# Altium footprint library BARKO_PCBLIB.PcbLib: 531 footprints (part 11 of 34)
Each footprint in its own frame and in the unit in brackets; x right, y up, seen from the top. Pads: shape width x height; smd on the part's side, far side on the other; paste and mask are expansions set on the pad; w line width, h text height; cw(c..) or ccw(c..) is an arc to the next point about the centre after c.
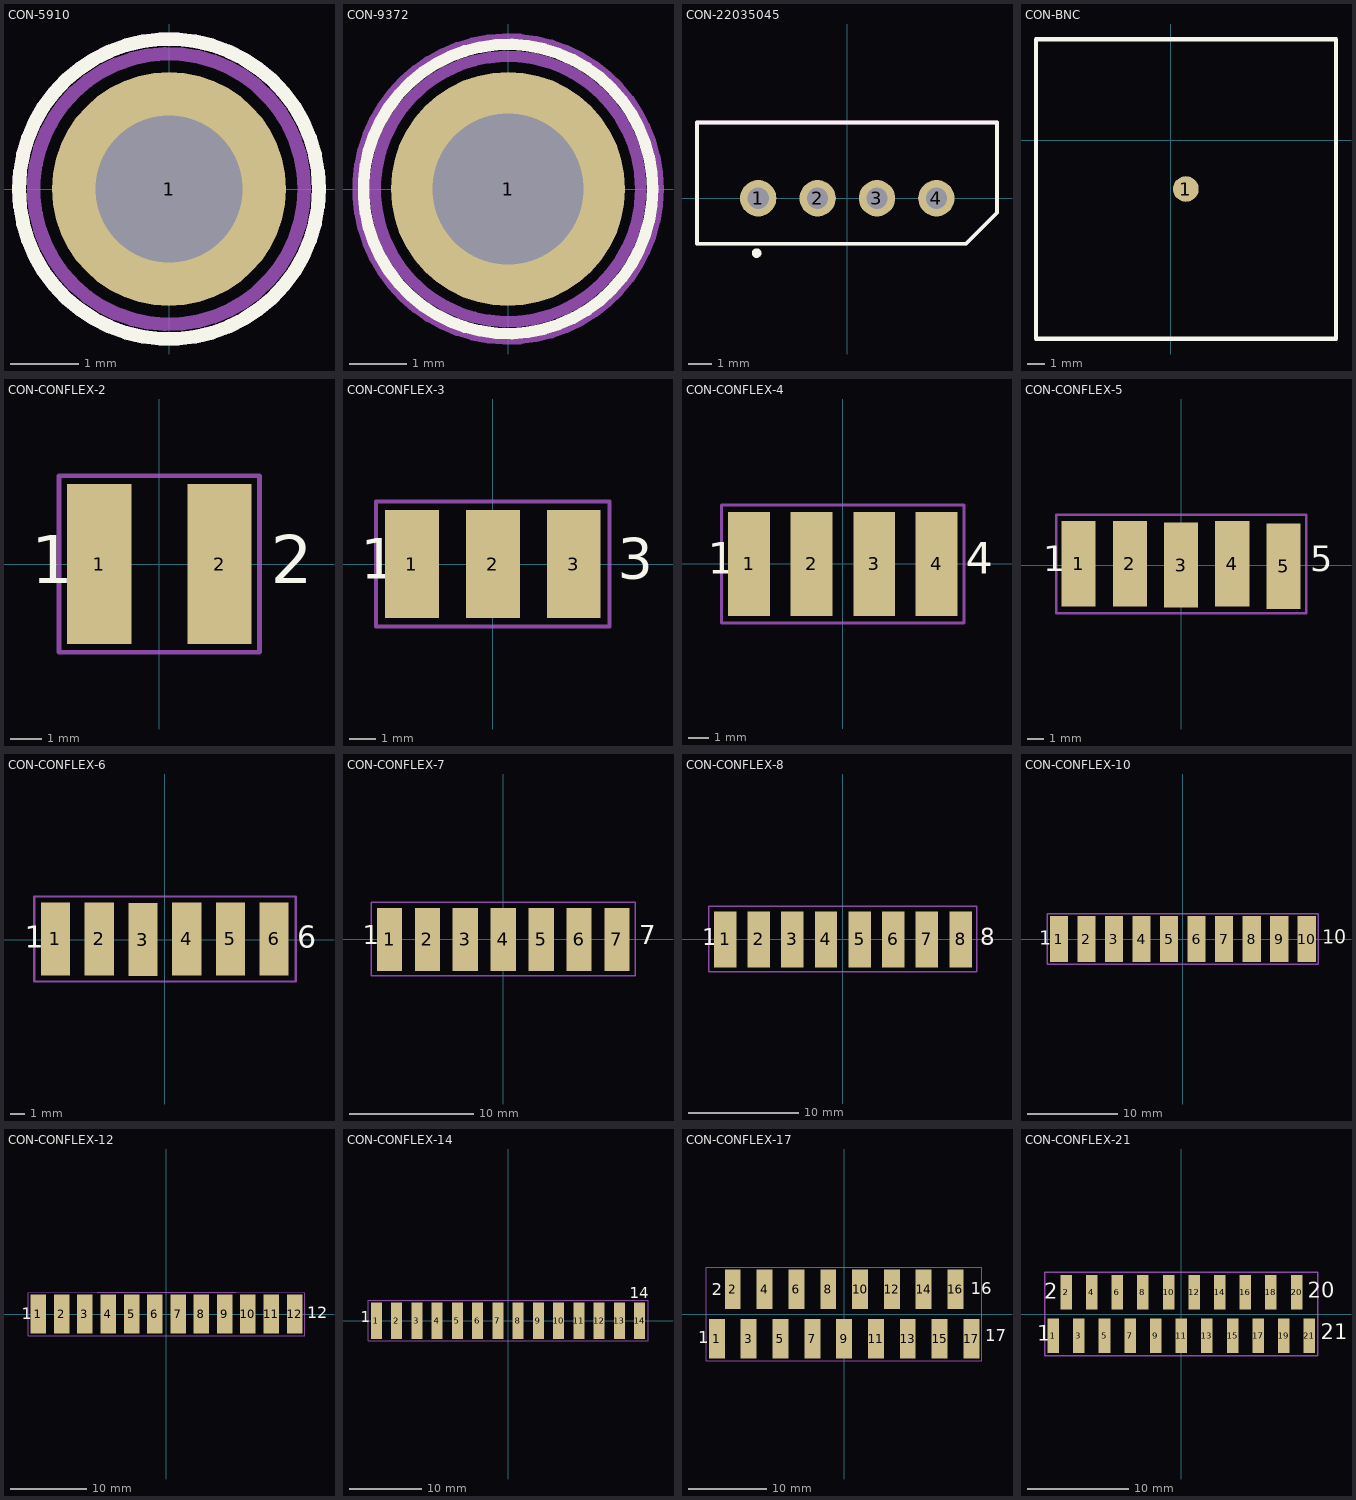
[diagram p10: the footprints below, top view; thin cyan lines are the x and y axes]

## CON-5910 [mil]
height 679.92
pads (1):
  round 135 hole 85: 1(0,0)
Top Overlay:
  circle w7.87: c0,0 r86.61
Mechanical 15:
  circle w7.87: c0,0 r86.61
  lines w3.94: -35.43,0 35.43,0 ; 0,-35.43 0,35.43
ASM Top:
  circle w7.87: c0,0 r78.15
  text ".designator" at -11.81,-3.94 h59.06
3D body "mill-max-5910-0-00-15-00-00-03-0.step": height 20.52, standoff -659.53, extent -55,-54.99 55,55.34

## CON-9372 [mil]
pads (1):
  round 160 hole 103: 1(0,0)
Top Overlay:
  circle w7.87: c0,0 r98.66
Bottom Overlay:
  circle w7.87: c0,0 r98.66
Mechanical 15:
  circle w7.87: c0,0 r102.36
  lines w3.94: -39.37,0 39.37,0 ; 0,-39.37 0,39.37
ASM Top:
  circle w7.87: c0,0 r90.64
  text ".designator" at -11.81,-11.81 h59.06
3D body "mill-max-9372-0-15-01-23-XX-10-0.step": height 12.54, standoff -107.5, extent -58.99,-58.99 59.05,59

## CON-22035045 [mil]
pads (4):
  round 60 hole 35: 1(-147,0) 2(-49,0) 3(49,0) 4(147,0)
Top Overlay:
  circle w7.87: c-149.61,-90.55 r3.94
  lines w5.91: 196,-75 247,-24
  lines w6: -248,-75 -248,125 247,125 247,-24 196,-75 -248,-75
ASM Top:
  lines w6: -248,-75 -248,125 247,125 247,-24 196,-75 -248,-75
  text ".designator" at -27.56,15.75 h31.5
3D body "022035045.stp": height 232.79, standoff -137.29, extent -244.1,-72.06 244.09,120.86

## CON-BNC [mm]
pads (1):
  round 1.5 smd: 1(0.88,-2.86)
Top Overlay:
  lines w0.254: -7.87,-11.61 9.643,-11.61 9.643,5.89 -7.87,5.89 -7.87,-11.61
3D body "Bnc_7684.stp": height 26.95, standoff 0.01, extent -7.87,-11.61 9.643,5.89

## CON-CONFLEX-2 [mil]
pads (2):
  rect 80x200 smd mask+4: 1(-75,0) 2(75,0)
Top Overlay:
  text "2" at 139,-24 h60
  text "1" at -160,-24 h60
ASM Top:
  lines w6: -125,-110 -125,110 125,110 125,-110 -125,-110

## CON-CONFLEX-3 [mil]
pads (3):
  rect 80x160 smd: 1(-120,0) 2(0,0) 3(120,0)
Top Overlay:
  text "1" at -196,-22 h60
  text "3" at 185,-22 h60
ASM Top:
  lines w6: -173,-93 -173,93 173,93 173,-93 -173,-93

## CON-CONFLEX-4 [mil]
pads (4):
  rect 80x200 smd: 1(-180,0) 2(-60,0) 3(60,0) 4(180,0)
Top Overlay:
  text "4" at 236,-19 h60
  text "1" at -259,-19 h60
ASM Top:
  lines w6: -233,-113 233,-113 233,113 -233,113 -233,-113

## CON-CONFLEX-5 [mil]
pads (5):
  rect 80x200 smd: 1(-240,3) 2(-120,3) 3(0,0) 4(120,3) 5(240,-3)
Top Overlay:
  text "1" at -323,-15 h60
  text "5" at 303,-15 h60
ASM Top:
  lines w6: -293,-113 -293,118 293,118 293,-113 -293,-113

## CON-CONFLEX-6 [mil]
pads (6):
  rect 80x200 smd: 1(-300,2) 2(-180,2) 3(-60,0) 4(60,2) 5(180,2) 6(300,2)
Top Overlay:
  text "6" at 363,-23 h60
  text "1" at -384,-23 h60
ASM Top:
  lines w6: -358,-115 359,-115 359,118 -358,118 -358,-115

## CON-CONFLEX-7 [mil]
pads (7):
  rect 80x200 smd: 1(-360,0) 2(-240,0) 3(-120,0) 4(0,0) 5(120,0) 6(240,0) 7(360,0)
Top Overlay:
  text "7" at 430,-15 h60
  text "1" at -445,-15 h60
ASM Top:
  lines w6: -418,-115 -418,118 418,118 418,-115 -418,-115

## CON-CONFLEX-8 [mil]
pads (8):
  rect 80x200 smd: 1(-420,0) 2(-300,0) 3(-180,0) 4(-60,0) 5(60,0) 6(180,0) 7(300,0) 8(420,0)
Top Overlay:
  text "1" at -501,-20 h60
  text "8" at 490,-20 h60
ASM Top:
  lines w6: -478,-115 -478,118 478,118 478,-115 -478,-115

## CON-CONFLEX-10 [mil]
pads (10):
  rect 80x200 smd mask+4: 1(-540,0) 2(-420,0) 3(-300,0) 4(-180,0) 5(-60,0) 6(60,0) 7(180,0) 8(300,0) 9(420,0) 10(540,0)
Top Overlay:
  text "10" at 608,-21 h60
  text "1" at -625,-25 h60
ASM Top:
  lines w6: -590,-110 590,-110 590,110 -590,110 -590,-110
  text ".designator" at -23.62,0 h31.5

## CON-CONFLEX-12 [mil]
pads (12):
  rect 80x200 smd mask+4: 1(-660,0) 2(-540,0) 3(-420,0) 4(-300,0) 5(-180,0) 6(-60,0) 7(60,0) 8(180,0) 9(300,0) 10(420,0) 11(540,0) 12(660,0)
Top Overlay:
  text "12" at 726,-23 h60
  text "1" at -746,-28 h60
ASM Top:
  lines w6: -713,-113 -713,110 -355.5,113 357.5,113 713,110 713,-113 -713,-113

## CON-CONFLEX-14 [mil]
pads (14):
  rect 60x200 smd mask+4: 1(-715,0) 2(-605,0) 3(-495,0) 4(-385,0) 5(-275,0) 6(-165,0) 7(-55,0) 8(55,0) 9(165,0) 10(275,0) 11(385,0) 12(495,0) 13(605,0) 14(715,0)
Top Overlay:
  text "1" at -801,-8 h60
  text "14" at 662,123 h60
ASM Top:
  lines w6: -760,-110 763,-110 763,110 -760,110 -760,-110

## CON-CONFLEX-17 [mil]
pads (17):
  rect 80x200 smd mask+4: 1(-640,-125) 2(-560,125) 3(-480,-125) 4(-400,125) 5(-320,-125) 6(-240,125) 7(-160,-125) 8(-80,125) 9(0,-125) 10(80,125) 11(160,-125) 12(240,125) 13(320,-125) 14(400,125) 15(480,-125) 16(560,125) 17(640,-125)
Top Overlay:
  text "17" at 709,-138 h60
  text "16" at 637,99 h60
  text "2" at -667,95 h60
  text "1" at -734,-148 h60
ASM Top:
  lines w6: -693,-235 693,-235 693,235 -693,235 -693,-235

## CON-CONFLEX-21 [mil]
pads (21):
  rect 45x135 smd: 1(-500,-85) 2(-450,85) 3(-400,-85) 4(-350,85) 5(-300,-85) 6(-250,85) 7(-200,-85) 8(-150,85) 9(-100,-85) 10(-50,85) 11(0,-85) 12(50,85) 13(100,-85) 14(150,85) 15(200,-85) 16(250,85) 17(300,-85) 18(350,85) 19(400,-85) 20(450,85) 21(500,-85)
Top Overlay:
  text "1" at -562,-105 h60
  text "2" at -535,60 h60
  text "20" at 493,63 h60
  text "21" at 544,-99 h60
ASM Top:
  lines w6: -533,-163 533,-163 533,163 -533,163 -533,-163